# Altium footprint library PCB贴片元件封装库.pcblib: 366 footprints (part 8 of 23)
Each footprint in its own frame and in the unit in brackets; x right, y up, seen from the top. Pads: shape width x height; smd on the part's side, far side on the other; paste and mask are expansions set on the pad; w line width, h text height; cw(c..) or ccw(c..) is an arc to the next point about the centre after c.
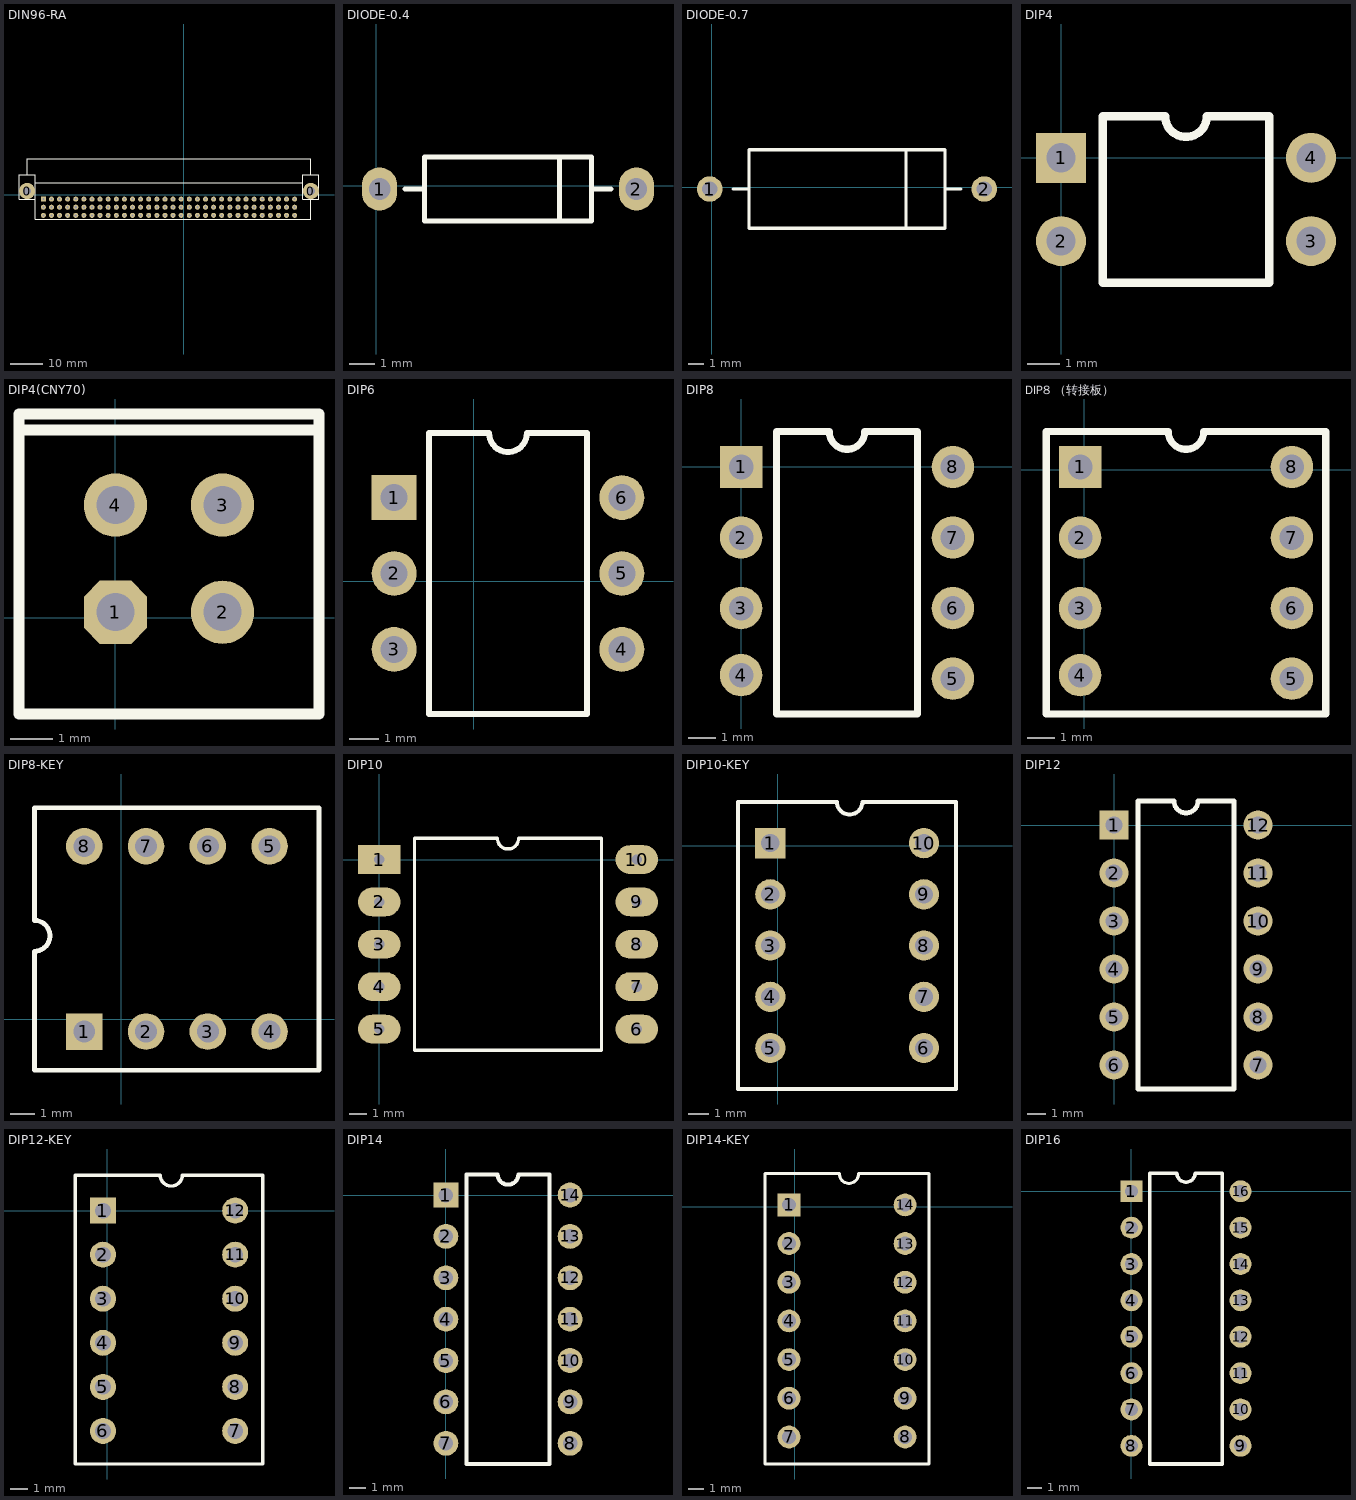
[diagram p7: the footprints below, top view; thin cyan lines are the x and y axes]

## DIN96-RA [mil]
pads (98):
  round 200 hole 100: 0(-1933.46,47.17) 0(1566.54,47.17)
  rect 62x62 hole 25: 1A(-1733.46,-52.83)
  round 62 hole 25: 1B(-1733.46,-152.83) 1C(-1733.46,-252.83) 2A(-1633.46,-52.83) 2B(-1633.46,-152.83) 2C(-1633.46,-252.83) 3A(-1533.46,-52.83) 3B(-1533.46,-152.83) 3C(-1533.46,-252.83) 4A(-1433.46,-52.83) 4B(-1433.46,-152.83) 4C(-1433.46,-252.83) 5A(-1333.46,-52.83) 5B(-1333.46,-152.83) 5C(-1333.46,-252.83) 6A(-1233.46,-52.83) 6B(-1233.46,-152.83) 6C(-1233.46,-252.83) 7A(-1133.46,-52.83) 7B(-1133.46,-152.83) 7C(-1133.46,-252.83) 8A(-1033.46,-52.83) 8B(-1033.46,-152.83) 8C(-1033.46,-252.83) 9A(-933.46,-52.83) 9B(-933.46,-152.83) 9C(-933.46,-252.83) 10A(-833.46,-52.83) 10B(-833.46,-152.83) 10C(-833.46,-252.83) 11A(-733.46,-52.83) 11B(-733.46,-152.83) 11C(-733.46,-252.83) 12A(-633.46,-52.83) 12B(-633.46,-152.83) 12C(-633.46,-252.83) 13A(-533.46,-52.83) 13B(-533.46,-152.83) 13C(-533.46,-252.83) 14A(-433.46,-52.83) 14B(-433.46,-152.83) 14C(-433.46,-252.83) 15A(-333.46,-52.83) 15B(-333.46,-152.83) 15C(-333.46,-252.83) 16A(-233.46,-52.83) 16B(-233.46,-152.83) 16C(-233.46,-252.83) 17A(-133.46,-52.83) 17B(-133.46,-152.83) 17C(-133.46,-252.83) 18A(-33.46,-52.83) 18B(-33.46,-152.83) 18C(-33.46,-252.83) 19A(66.54,-52.83) 19B(66.54,-152.83) 19C(66.54,-252.83) 20A(166.54,-52.83) 20B(166.54,-152.83) 20C(166.54,-252.83) 21A(266.54,-52.83) 21B(266.54,-152.83) 21C(266.54,-252.83) 22A(366.54,-52.83) 22B(366.54,-152.83) 22C(366.54,-252.83) 23A(466.54,-52.83) 23B(466.54,-152.83) 23C(466.54,-252.83) 24A(566.54,-52.83) 24B(566.54,-152.83) 24C(566.54,-252.83) 25A(666.54,-52.83) 25B(666.54,-152.83) 25C(666.54,-252.83) 26A(766.54,-52.83) 26B(766.54,-152.83) 26C(766.54,-252.83) 27A(866.54,-52.83) 27B(866.54,-152.83) 27C(866.54,-252.83) 28A(966.54,-52.83) 28B(966.54,-152.83) 28C(966.54,-252.83) 29A(1066.54,-52.83) 29B(1066.54,-152.83) 29C(1066.54,-252.83) 30A(1166.54,-52.83) 30B(1166.54,-152.83) 30C(1166.54,-252.83) 31A(1266.54,-52.83) 31B(1266.54,-152.83) 31C(1266.54,-252.83) 32A(1366.54,-52.83) 32B(1366.54,-152.83) 32C(1366.54,-252.83)
TopOverlay:
  lines w10: -1833.46,147.17 1466.54,147.17 ; 1566.54,-52.83 1566.54,-302.83 -1833.46,-302.83 -1833.46,-52.83 ; -1933.46,247.17 -1833.46,247.17 -1833.46,-52.83 ; -1933.46,247.17 -2033.46,247.17 -2033.46,-52.83 -1833.46,-52.83 ; -1933.46,247.17 -1933.46,447.17 1566.54,447.17 1566.54,247.17 ; 1566.54,247.17 1666.54,247.17 1666.54,-52.83 1466.54,-52.83 1466.54,247.17 1566.54,247.17

## DIODE-0.4 [mm]
pads (2):
  oval 1.4x1.7 hole 0.85: 1(0.127,-0.127) 2(10.287,-0.127)
TopOverlay:
  lines w0.2: 1.143,-0.127 1.905,-0.127 ; 7.239,-1.397 7.239,1.143 ; 8.509,-0.127 9.271,-0.127 ; 1.905,-1.397 1.905,1.143 8.509,1.143 8.509,-1.397 1.905,-1.397

## DIODE-0.7 [mm]
pads (2):
  round 1.65 hole 1: 1(-0.127,-0.127) 2(17.653,-0.127)
TopOverlay:
  lines w0.2: 1.397,-0.127 2.413,-0.127 ; 12.573,-2.667 12.573,2.413 ; 15.113,-0.127 16.129,-0.127 ; 2.413,-2.667 15.113,-2.667 15.113,2.413 2.413,2.413 2.413,-2.667

## DIP4 [mil]
pads (4):
  rect 60x60 hole 35: 1(0,0)
  round 60 hole 35: 2(0,-100) 3(300,-100) 4(300,0)
TopOverlay:
  lines w10: 50,-150 50,50 125,50 ccw(c150,50) 175,50 250,50 250,-150 50,-150

## DIP4(CNY70) [mm]
pads (4):
  oct 1.5x1.5 hole 0.9: 1(0,0.127)
  round 1.5 hole 0.9: 2(2.54,0.127) 3(2.54,2.667) 4(0,2.667)
TopOverlay:
  lines w0.254: -2.286,4.445 4.826,4.445 ; -2.286,-2.286 -2.286,4.826 4.826,4.826 4.826,-2.286 -2.286,-2.286

## DIP6 [mm]
pads (6):
  rect 1.5x1.5 hole 0.9: 1(-2.667,2.794)
  round 1.5 hole 0.9: 2(-2.667,0.254) 3(-2.667,-2.286) 4(4.953,-2.286) 5(4.953,0.254) 6(4.953,2.794)
TopOverlay:
  lines w0.2: -1.507,-4.446 -1.507,4.954 0.508,4.954 ccw(c1.143,4.954) 1.778,4.954 3.793,4.954 3.793,-4.446 -1.507,-4.446

## DIP8 [mil]
pads (8):
  rect 60x60 hole 35: 1(0,0)
  round 60 hole 35: 2(0,-100) 3(0,-200) 4(0,-295) 5(300,-300) 6(300,-200) 7(300,-100) 8(300,0)
TopOverlay:
  lines w10: 50,-350 250,-350 250,50 175,50 cw(c150,50) 125,50 50,50 50,-350

## DIP8 （转接板） [mil]
pads (8):
  rect 60x60 hole 35: 1(-6,4)
  round 60 hole 35: 2(-6,-96) 3(-6,-196) 4(-6,-291) 5(294,-296) 6(294,-196) 7(294,-96) 8(294,4)
TopOverlay:
  lines w10: -54,-346 -54,54 119,54 ccw(c144,54) 169,54 342,54 342,-346 -54,-346

## DIP8-KEY [mm]
pads (8):
  rect 1.5x1.5 hole 0.9: 1(-1.524,-0.508)
  round 1.5 hole 0.9: 2(1.016,-0.508) 3(3.556,-0.508) 4(6.096,-0.508) 5(6.096,7.112) 6(3.556,7.112) 7(1.016,7.112) 8(-1.524,7.112)
TopOverlay:
  lines w0.2: -3.574,4.062 cw(c-3.574,3.427) -3.574,2.792 -3.574,-2.098 8.128,-2.098 8.128,8.692 -3.574,8.692 -3.574,4.092

## DIP10 [mm]
pads (10):
  rect 2.5x1.7 hole 0.6: 1(0,0)
  oval 2.5x1.7 hole 0.6: 2(0,-2.5) 3(0,-5) 4(0,-7.5) 5(0,-10) 6(15.2,-10) 7(15.2,-7.5) 8(15.2,-5) 9(15.2,-2.5) 10(15.2,0)
TopOverlay:
  lines w0.2: 2.085,-11.25 13.115,-11.25 13.115,1.25 8.225,1.25 cw(c7.6,1.25) 6.975,1.25 2.085,1.25 2.085,-11.25

## DIP10-KEY [mm]
pads (10):
  rect 1.5x1.5 hole 0.9: 1(-0.381,0.127)
  round 1.5 hole 0.9: 2(-0.381,-2.413) 3(-0.381,-4.953) 4(-0.381,-7.493) 5(-0.381,-10.033) 6(7.239,-10.033) 7(7.239,-7.493) 8(7.239,-4.953) 9(7.239,-2.413) 10(7.239,0.127)
TopOverlay:
  lines w0.2: 4.189,2.177 cw(c3.554,2.177) 2.919,2.177 -1.971,2.177 -1.971,-12.065 8.819,-12.065 8.819,2.177 4.219,2.177

## DIP12 [mil]
pads (12):
  rect 60x60 hole 35: 1(0,0)
  round 60 hole 35: 2(0,-100) 3(0,-200) 4(0,-300) 5(0,-400) 6(0,-500) 7(300,-500) 8(300,-400) 9(300,-300) 10(300,-200) 11(300,-100) 12(300,0)
TopOverlay:
  lines w10: 50,-550 50,50 125,50 ccw(c150,50) 175,50 250,50 250,-550 50,-550

## DIP12-KEY [mm]
pads (12):
  rect 1.5x1.5 hole 0.9: 1(-0.254,0)
  round 1.5 hole 0.9: 2(-0.254,-2.54) 3(-0.254,-5.08) 4(-0.254,-7.62) 5(-0.254,-10.16) 6(-0.254,-12.7) 7(7.366,-12.7) 8(7.366,-10.16) 9(7.366,-7.62) 10(7.366,-5.08) 11(7.366,-2.54) 12(7.366,0)
TopOverlay:
  lines w0.2: 4.316,2.05 cw(c3.681,2.05) 3.046,2.05 -1.844,2.05 -1.844,-14.605 8.946,-14.605 8.946,2.05 4.346,2.05

## DIP14 [mil]
pads (14):
  rect 60x60 hole 35: 1(0,0)
  round 60 hole 35: 2(0,-100) 3(0,-200) 4(0,-300) 5(0,-400) 6(0,-500) 7(0,-600) 8(300,-600) 9(300,-500) 10(300,-400) 11(300,-300) 12(300,-200) 13(300,-100) 14(300,0)
TopOverlay:
  lines w10: 50,-650 50,50 125,50 ccw(c150,50) 175,50 250,50 250,-650 50,-650

## DIP14-KEY [mm]
pads (14):
  rect 1.5x1.5 hole 0.9: 1(-0.381,0.127)
  round 1.5 hole 0.9: 2(-0.381,-2.413) 3(-0.381,-4.953) 4(-0.381,-7.493) 5(-0.381,-10.033) 6(-0.381,-12.573) 7(-0.381,-15.113) 8(7.239,-15.113) 9(7.239,-12.573) 10(7.239,-10.033) 11(7.239,-7.493) 12(7.239,-4.953) 13(7.239,-2.413) 14(7.239,0.127)
TopOverlay:
  lines w0.2: 4.189,2.177 cw(c3.554,2.177) 2.919,2.177 -1.971,2.177 -1.971,-16.891 8.819,-16.891 8.819,2.177 4.219,2.177

## DIP16 [mil]
pads (16):
  rect 60x60 hole 35: 1(0,0)
  round 60 hole 35: 2(0,-100) 3(0,-200) 4(0,-300) 5(0,-400) 6(0,-500) 7(0,-600) 8(0,-700) 9(300,-700) 10(300,-600) 11(300,-500) 12(300,-400) 13(300,-300) 14(300,-200) 15(300,-100) 16(300,0)
TopOverlay:
  lines w10: 50,-750 50,50 125,50 ccw(c150,50) 175,50 250,50 250,-750 50,-750